# Altium footprint library PTH-Footprint.PcbLib: 58 footprints (part 3 of 4)
Each footprint in its own frame and in the unit in brackets; x right, y up, seen from the top. Pads: shape width x height; smd on the part's side, far side on the other; paste and mask are expansions set on the pad; w line width, h text height; cw(c..) or ccw(c..) is an arc to the next point about the centre after c.
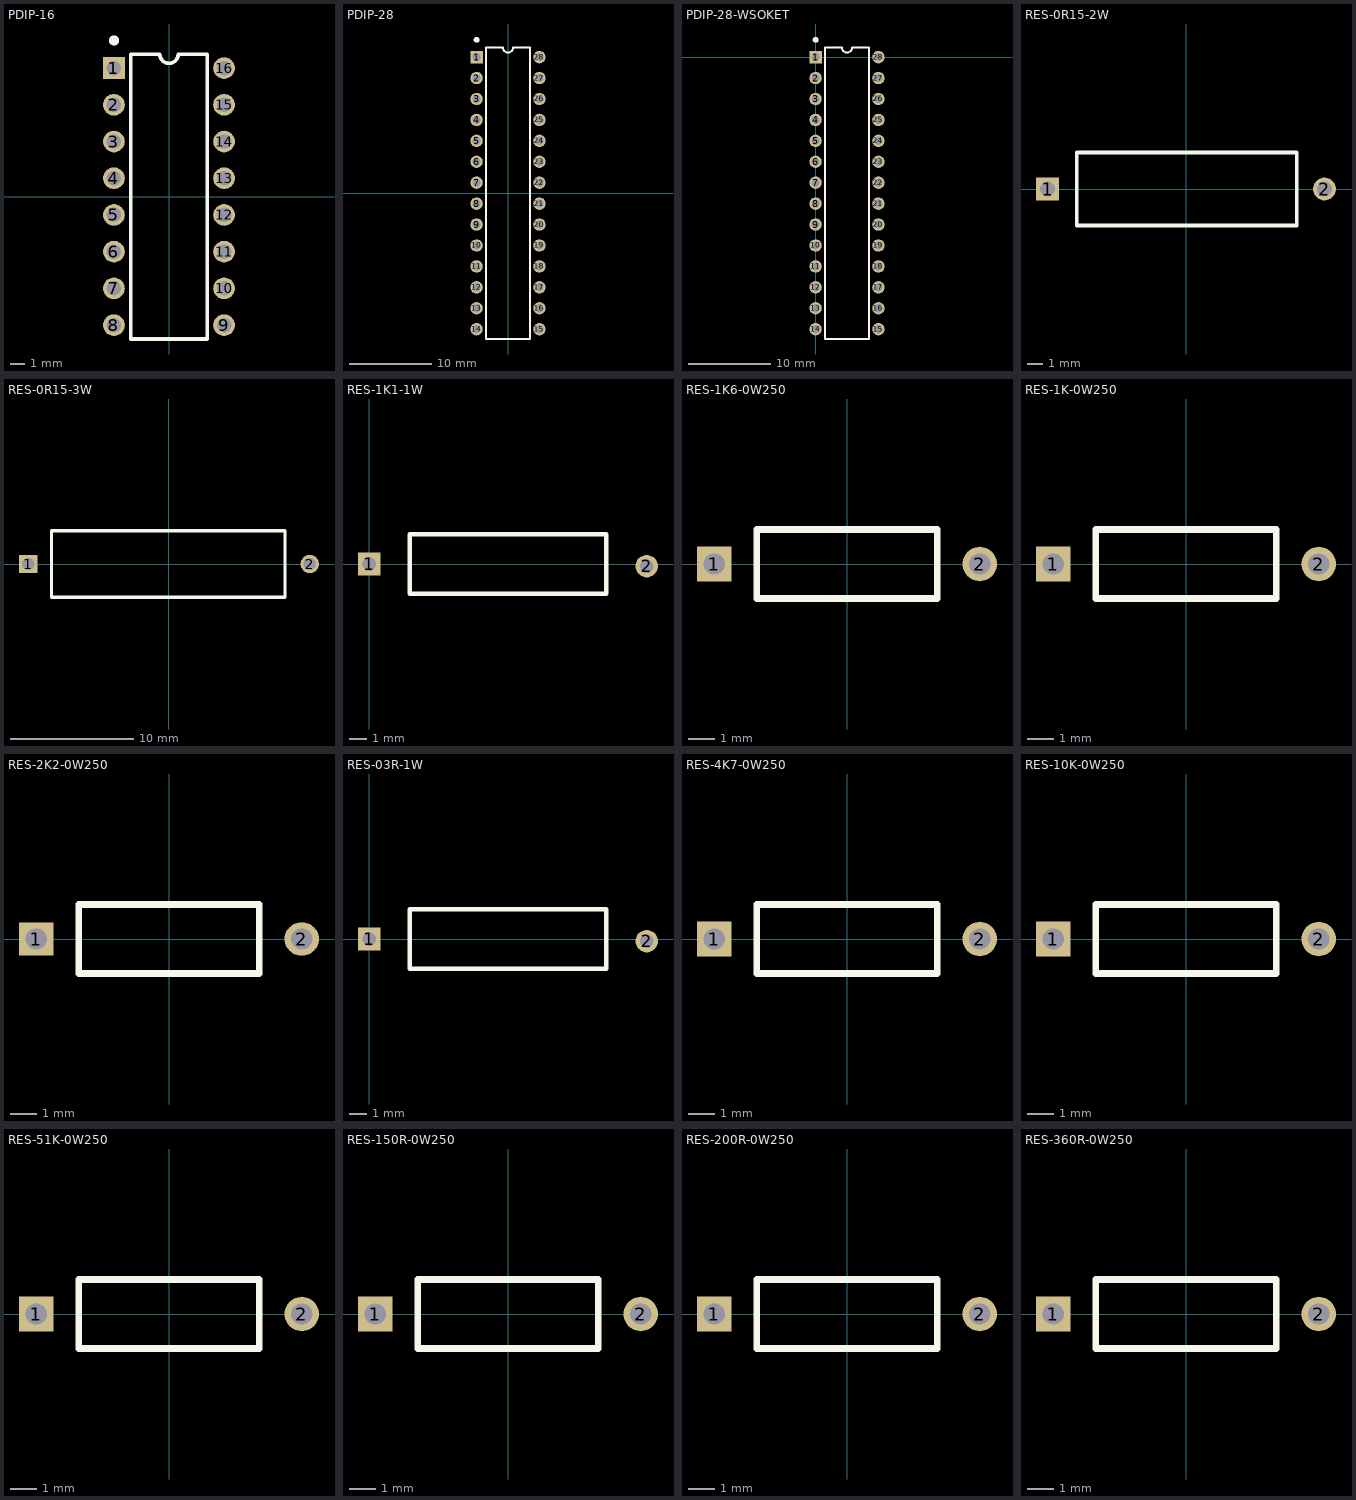
[diagram p2: the footprints below, top view; thin cyan lines are the x and y axes]

## PDIP-16 [mm] "DIP, 16-Leads, Body 19.7x6.6mm, Pitch 2.54mm"
height 5.08
pads (16):
  rect 1.5x1.5 hole 1: 1(-3.81,8.89)
  round 1.5 hole 1: 2(-3.81,6.35) 3(-3.81,3.81) 4(-3.81,1.27) 5(-3.81,-1.27) 6(-3.81,-3.81) 7(-3.81,-6.35) 8(-3.81,-8.89) 9(3.81,-8.89) 10(3.81,-6.35) 11(3.81,-3.81) 12(3.81,-1.27) 13(3.81,1.27) 14(3.81,3.81) 15(3.81,6.35) 16(3.81,8.89)
Top Overlay:
  circle w0.5: c-3.8,10.8 r0.1
  lines w0.254: -2.65,-9.85 -2.65,9.85 -0.635,9.85 ccw(c0,9.85) 0.635,9.85 2.65,9.85 2.65,-9.85 -2.65,-9.85
3D body "N0016A.stp": height 5.12, standoff -3.25, extent -3.937,-9.842 3.937,9.842

## PDIP-28 [mm] "28-Pin Plastic Dual In-Line Package (PDIP)"
height 4.58
pads (28):
  rect 1.5x1.5 hole 1: 1(-3.81,16.51)
  round 1.5 hole 1: 2(-3.81,13.97) 3(-3.81,11.43) 4(-3.81,8.89) 5(-3.81,6.35) 6(-3.81,3.81) 7(-3.81,1.27) 8(-3.81,-1.27) 9(-3.81,-3.81) 10(-3.81,-6.35) 11(-3.81,-8.89) 12(-3.81,-11.43) 13(-3.81,-13.97) 14(-3.81,-16.51) 15(3.81,-16.51) 16(3.81,-13.97) 17(3.81,-11.43) 18(3.81,-8.89) 19(3.81,-6.35) 20(3.81,-3.81) 21(3.81,-1.27) 22(3.81,1.27) 23(3.81,3.81) 24(3.81,6.35) 25(3.81,8.89) 26(3.81,11.43) 27(3.81,13.97) 28(3.81,16.51)
Top Overlay:
  circle w0.5: c-3.81,18.61 r0.1
  lines w0.254: -2.65,-17.7 -2.65,17.7 -0.635,17.7 ccw(c0,17.7) 0.635,17.7 2.65,17.7 2.65,-17.7 -2.65,-17.7
3D body "DIP28-BLK.STEP": height 4.7, standoff -2.6, extent -3.935,-17.6 3.935,17.6

## PDIP-28-WSOKET [mm] "28-Pin Plastic Dual In-Line Package (PDIP)"
height 4.58
pads (28):
  rect 1.5x1.5 hole 1: 1(0,0)
  round 1.5 hole 1: 2(0,-2.54) 3(0,-5.08) 4(0,-7.62) 5(0,-10.16) 6(0,-12.7) 7(0,-15.24) 8(0,-17.78) 9(0,-20.32) 10(0,-22.86) 11(0,-25.4) 12(0,-27.94) 13(0,-30.48) 14(0,-33.02) 15(7.62,-33.02) 16(7.62,-30.48) 17(7.62,-27.94) 18(7.62,-25.4) 19(7.62,-22.86) 20(7.62,-20.32) 21(7.62,-17.78) 22(7.62,-15.24) 23(7.62,-12.7) 24(7.62,-10.16) 25(7.62,-7.62) 26(7.62,-5.08) 27(7.62,-2.54) 28(7.62,0)
Top Overlay:
  circle w0.5: c0,2.1 r0.1
  lines w0.254: 1.16,-34.21 6.46,-34.21 6.46,1.19 4.445,1.19 cw(c3.81,1.19) 3.175,1.19 1.16,1.19 1.16,-34.21
3D body "DIP-28 W7.62mm IC with Socket.stp": height 7.88, standoff -3.13, extent -1.27,-34.815 8.93,1.795

## RES-0R15-2W [mm]
pads (2):
  rect 1.5x1.5 hole 1 paste-2539.97 mask+0: 1(-9,0)
  round 1.5 hole 1 paste-2539.97 mask+0: 2(9,0)
Top Overlay:
  lines w0.254: -7.1,-2.362 7.2,-2.362 7.2,2.362 -7.1,2.362 -7.1,-2.362
3D body "0R15.STEP": height 4.82, standoff -2.57, extent -9.243,-2.418 9.241,2.362

## RES-0R15-3W [mm]
pads (2):
  rect 1.5x1.5 hole 1 paste-2539.97 mask+0: 1(-11.45,0)
  round 1.5 hole 1 paste-2539.97 mask+0: 2(11.45,0)
Top Overlay:
  lines w0.254: -9.55,-2.7 9.45,-2.7 9.45,2.7 -9.55,2.7 -9.55,-2.7
3D body "0R15-3W.STEP": height 6, standoff -7.79, extent -11.88,-3.51 11.78,3.884

## RES-1K1-1W [mm]
pads (2):
  rect 1.3x1.3 hole 0.8 paste-2539.97 mask+0: 1(0,0)
  round 1.3 hole 0.8 paste-2539.97 mask+0: 2(16.002,-0.127)
Top Overlay:
  lines w0.254: 2.324,-1.714 2.324,1.714 13.678,1.714 13.678,-1.714 2.324,-1.714
3D body "1K1.STEP": height 4.99, standoff -2, extent -0.349,-2.127 16.351,1.873

## RES-1K6-0W250 [mm]
pads (2):
  rect 1.3x1.3 hole 0.8 paste-2539.97 mask+0: 1(-5,0)
  round 1.3 hole 0.8 paste-2539.97 mask+0: 2(5,0)
Top Overlay:
  lines w0.254: -3.4,-1.3 3.4,-1.3 3.4,1.3 -3.4,1.3 -3.4,-1.3
Top 3D Body (Mech5):
  lines w0.2: -3.4,-1.3 3.4,-1.3 3.4,1.3 -3.4,1.3 -3.4,-1.3
3D body "1K6.STEP": height 3.1, standoff -1.3, extent -5.303,-1.201 5.357,1.201

## RES-1K-0W250 [mm]
pads (2):
  rect 1.3x1.3 hole 0.8 paste-2539.97 mask+0: 1(-5,0)
  round 1.3 hole 0.8 paste-2539.97 mask+0: 2(5,0)
Top Overlay:
  lines w0.254: -3.4,-1.3 3.4,-1.3 3.4,1.3 -3.4,1.3 -3.4,-1.3
Top 3D Body (Mech5):
  lines w0.2: -3.4,-1.3 3.4,-1.3 3.4,1.3 -3.4,1.3 -3.4,-1.3
3D body "1K.STEP": height 3.1, standoff -1.3, extent -5.303,-1.201 5.357,1.201

## RES-2K2-0W250 [mm]
pads (2):
  rect 1.3x1.25 hole 0.8 paste-2539.97 mask+0: 1(-5,0)
  oval 1.3x1.25 hole 0.8 paste-2539.97 mask+0: 2(5,0)
Top Overlay:
  lines w0.254: -3.4,-1.3 -3.4,1.3 3.4,1.3 3.4,-1.3 -3.4,-1.3
Top 3D Body (Mech5):
  lines w0.2: -3.4,-1.3 -3.4,1.3 3.4,1.3 3.4,-1.3 -3.4,-1.3
3D body "2K2.STEP": height 3.1, standoff -1.3, extent -5.303,-1.201 5.357,1.201

## RES-03R-1W [mm]
pads (2):
  rect 1.3x1.3 hole 0.8 paste-2539.97 mask+0: 1(0,0)
  round 1.3 hole 0.8 paste-2539.97 mask+0: 2(16.002,-0.127)
Top Overlay:
  lines w0.254: 2.324,-1.714 13.678,-1.714 13.678,1.714 2.324,1.714 2.324,-1.714
3D body "03R.STEP": height 4.99, standoff -2, extent -0.349,-2.127 16.351,1.873

## RES-4K7-0W250 [mm]
pads (2):
  rect 1.3x1.3 hole 0.8 paste-2539.97 mask+0: 1(-5,0)
  round 1.3 hole 0.8 paste-2539.97 mask+0: 2(5,0)
Top Overlay:
  lines w0.254: -3.4,-1.3 3.4,-1.3 3.4,1.3 -3.4,1.3 -3.4,-1.3
Top 3D Body (Mech5):
  lines w0.2: -3.4,-1.3 3.4,-1.3 3.4,1.3 -3.4,1.3 -3.4,-1.3
3D body "4K7.STEP": height 3.1, standoff -1.3, extent -5.303,-1.201 5.357,1.201

## RES-10K-0W250 [mm]
pads (2):
  rect 1.3x1.3 hole 0.8 paste-2539.97 mask+0: 1(-5,0)
  round 1.3 hole 0.8 paste-2539.97 mask+0: 2(5,0)
Top Overlay:
  lines w0.254: -3.4,-1.3 3.4,-1.3 3.4,1.3 -3.4,1.3 -3.4,-1.3
Top 3D Body (Mech5):
  lines w0.2: -3.4,-1.3 3.4,-1.3 3.4,1.3 -3.4,1.3 -3.4,-1.3
3D body "10K.STEP": height 3.1, standoff -1.3, extent -5.303,-1.201 5.357,1.201

## RES-51K-0W250 [mm]
pads (2):
  rect 1.3x1.3 hole 0.8 paste-2539.97 mask+0: 1(-5,0)
  round 1.3 hole 0.8 paste-2539.97 mask+0: 2(5,0)
Top Overlay:
  lines w0.254: -3.4,-1.3 3.4,-1.3 3.4,1.3 -3.4,1.3 -3.4,-1.3
Top 3D Body (Mech5):
  lines w0.2: -3.4,-1.3 3.4,-1.3 3.4,1.3 -3.4,1.3 -3.4,-1.3
3D body "51K.STEP": height 3.1, standoff -1.3, extent -5.303,-1.201 5.357,1.201

## RES-150R-0W250 [mm]
pads (2):
  rect 1.3x1.3 hole 0.8 paste-2539.97 mask+0: 1(-5,0)
  round 1.3 hole 0.8 paste-2539.97 mask+0: 2(5,0)
Top Overlay:
  lines w0.254: -3.4,-1.3 -3.4,1.3 3.4,1.3 3.4,-1.3 -3.4,-1.3
Top 3D Body (Mech5):
  lines w0.2: -3.4,-1.3 -3.4,1.3 3.4,1.3 3.4,-1.3 -3.4,-1.3
3D body "150R.STEP": height 3.1, standoff -1.3, extent -5.303,-1.201 5.357,1.201

## RES-200R-0W250 [mm]
pads (2):
  rect 1.3x1.3 hole 0.8 paste-2539.97 mask+0: 1(-5,0)
  round 1.3 hole 0.8 paste-2539.97 mask+0: 2(5,0)
Top Overlay:
  lines w0.254: -3.4,-1.3 -3.4,1.3 3.4,1.3 3.4,-1.3 -3.4,-1.3
Top 3D Body (Mech5):
  lines w0.2: -3.4,-1.3 -3.4,1.3 3.4,1.3 3.4,-1.3 -3.4,-1.3
3D body "200R.STEP": height 3.1, standoff -1.3, extent -5.303,-1.201 5.357,1.201

## RES-360R-0W250 [mm]
pads (2):
  rect 1.3x1.3 hole 0.8 paste-2539.97 mask+0: 1(-5,0)
  round 1.3 hole 0.8 paste-2539.97 mask+0: 2(5,0)
Top Overlay:
  lines w0.254: -3.4,-1.3 -3.4,1.3 3.4,1.3 3.4,-1.3 -3.4,-1.3
Top 3D Body (Mech5):
  lines w0.2: -3.4,-1.3 -3.4,1.3 3.4,1.3 3.4,-1.3 -3.4,-1.3
3D body "360R.STEP": height 3.1, standoff -1.3, extent -5.303,-1.201 5.357,1.201